# Altium footprint library PcbLib.PcbLib: 428 footprints (part 1 of 27)
Each footprint in its own frame and in the unit in brackets; x right, y up, seen from the top. Pads: shape width x height; smd on the part's side, far side on the other; paste and mask are expansions set on the pad; w line width, h text height; cw(c..) or ccw(c..) is an arc to the next point about the centre after c.
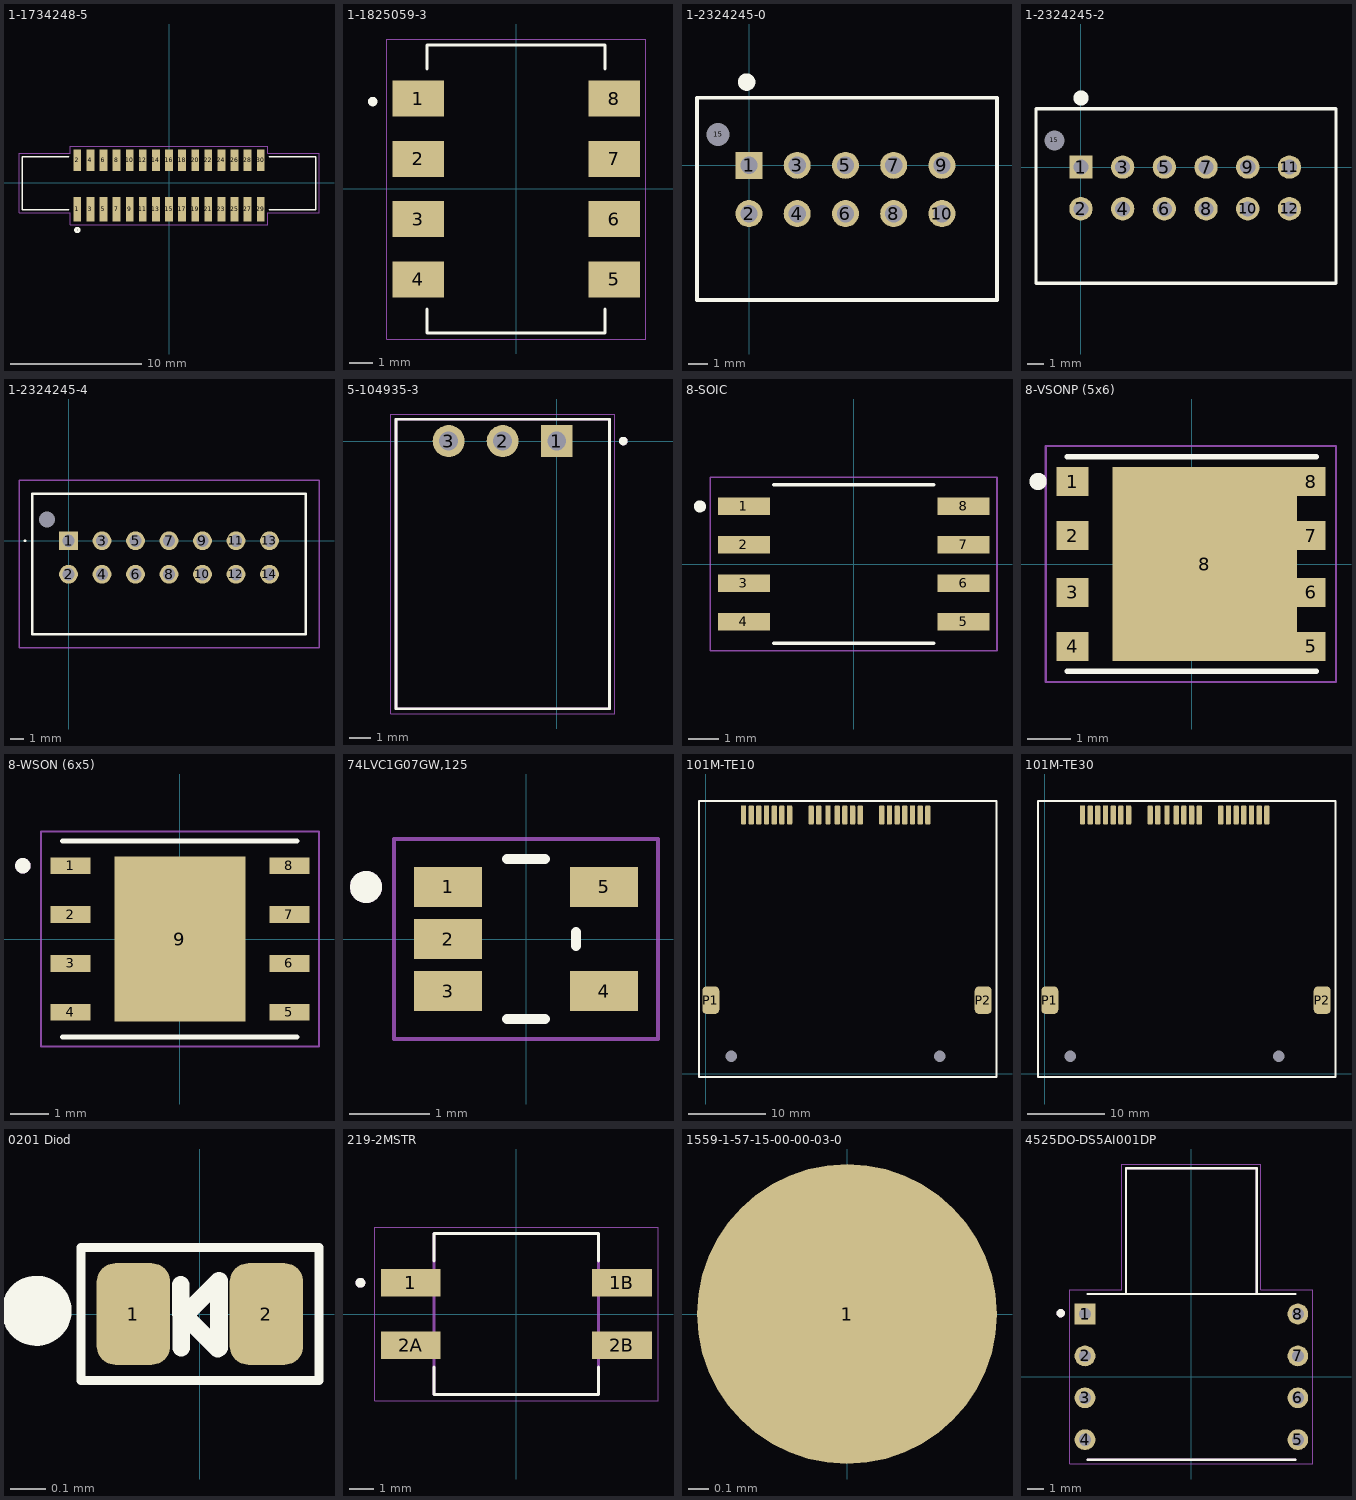
[diagram p0: the footprints below, top view; thin cyan lines are the x and y axes]

## 1-1734248-5 [mm]
pads (30):
  rect 0.6x1.85 smd: 1(-7,-2.025) 3(-6,-2.025) 5(-5,-2.025) 7(-4,-2.025) 9(-3,-2.025) 11(-2,-2.025) 13(-1,-2.025) 15(0,-2.025) 17(1,-2.025) 19(2,-2.025) 21(3,-2.025) 23(4,-2.025) 25(5,-2.025) 27(6,-2.025) 29(7,-2.025)
  rect 0.6x1.65 smd: 2(-7,1.725) 4(-6,1.725) 6(-5,1.725) 8(-4,1.725) 10(-3,1.725) 12(-2,1.725) 14(-1,1.725) 16(0,1.725) 18(1,1.725) 20(2,1.725) 22(3,1.725) 24(4,1.725) 26(5,1.725) 28(6,1.725) 30(7,1.725)
Top Overlay:
  circle w0.2: c-7,-3.6 r0.141
  lines w0.127: -7.65,-2.05 -11.2,-2.05 -11.2,2 -7.65,2 ; 7.65,-2.05 11.2,-2.05 11.2,2 7.65,2
Mechanical 15:
  lines w0.05: -11.45,-2.3 -7.55,-2.3 -7.55,-3.2 7.55,-3.2 7.55,-2.3 11.45,-2.3 11.45,2.25 7.55,2.25 7.55,2.8 -7.55,2.8 -7.55,2.25 -11.45,2.25 -11.45,-2.3
3D body "1-1734248-5--3DModel-STEP-56544.STEP": height 7.7, standoff 0, extent -11.2,-2.551 11.2,2.298

## 1-1825059-3 [mm]
pads (8):
  rect 2.16x1.52 smd: 1(-4.13,3.81) 2(-4.13,1.27) 3(-4.13,-1.27) 4(-4.13,-3.81) 5(4.13,-3.81) 6(4.13,-1.27) 7(4.13,1.27) 8(4.13,3.81)
Top Overlay:
  circle w0.2: c-6.044,3.684 r0.1
  lines w0.127: -3.75,-5.064 -3.75,-6.07 3.75,-6.07 3.75,-5.064 ; -3.75,5.064 -3.75,6.07 3.75,6.07 3.75,5.064
Mechanical 15:
  lines w0.05: -5.455,-6.32 -5.455,6.32 5.455,6.32 5.455,-6.32 -5.455,-6.32
3D body "1-1825059-3.stp": height 4.57, standoff 0.13, extent -4.659,-6.07 4.659,6.07

## 1-2324245-0 [mm]
pads (11):
  rect 1.4x1.4 hole 0.9: 1(0,0)
  round 1.4 hole 0.9: 2(0,-2.5) 3(2.5,0) 4(2.5,-2.5) 5(5,0) 6(5,-2.5) 7(7.5,0) 8(7.5,-2.5) 9(10,0) 10(10,-2.5)
  round 0.6 hole 1.2 unplated: 15(-1.6,1.6)
Top Overlay:
  lines w0.2: -2.695,-6.97 12.852,-6.97 12.852,3.5 -2.695,3.5 -2.695,-6.97
  lines w0.508: -0.326,4.318 cw(c-0.126,4.318) 0.074,4.318 cw(c-0.126,4.318) -0.326,4.318
3D body "1-2324245-0.stp": height 10, standoff -3.2, extent -2.64,-6.985 12.75,3.485

## 1-2324245-2 [mm]
pads (13):
  rect 1.4x1.4 hole 0.9: 1(0,0)
  round 1.4 hole 0.9: 2(0,-2.5) 3(2.5,0) 4(2.5,-2.5) 5(5,0) 6(5,-2.5) 7(7.5,0) 8(7.5,-2.5) 9(10,0) 10(10,-2.5) 11(12.5,0) 12(12.5,-2.5)
  round 0.6 hole 1.2 unplated: 15(-1.6,1.6)
Top Overlay:
  lines w0.2: -2.695,-6.97 -2.695,3.5 15.291,3.5 15.291,-6.97 -2.695,-6.97
  lines w0.508: -0.199,4.14 ccw(c0.001,4.14) 0.201,4.14 ccw(c0.001,4.14) -0.199,4.14
3D body "1-2324245-2.stp": height 10, standoff -3.2, extent -2.646,-6.99 15.244,3.48

## 1-2324245-4 [mm]
pads (15):
  rect 1.4x1.4 hole 0.9: 1(0,0)
  round 1.4 hole 0.9: 2(0,-2.5) 3(2.5,0) 4(2.5,-2.5) 5(5,0) 6(5,-2.5) 7(7.5,0) 8(7.5,-2.5) 9(10,0) 10(10,-2.5) 11(12.5,0) 12(12.5,-2.5) 13(15,0) 14(15,-2.5)
  round 0.6 hole 1.2 unplated: 15(-1.6,1.6)
Top Overlay:
  lines w0.1: -3.3,0 ccw(c-3.25,0) -3.2,0 ccw(c-3.25,0) -3.3,0
  lines w0.2: -2.695,-6.97 -2.695,3.5 17.695,3.5 17.695,-6.97 -2.695,-6.97
Mechanical 15:
  lines w0.1: -3.695,-7.97 -3.695,4.5 18.695,4.5 18.695,-7.97 -3.695,-7.97
3D body "1-2324245-4.stp": height 9.83, standoff -3.37, extent -2.695,-6.97 17.695,3.5

## 5-104935-3 [mm]
pads (3):
  rect 1.5x1.5 hole 0.89: 1(0,0)
  round 1.5 hole 0.89: 2(-2.54,0) 3(-5.08,0)
Top Overlay:
  circle w0.2: c3.125,0 r0.1
  lines w0.127: -7.555,-12.57 2.475,-12.57 2.475,1.02 -7.555,1.02 -7.555,-12.57
Mechanical 13:
  circle w0.2: c3.125,0 r0.1
  lines w0.127: -7.555,-12.57 2.475,-12.57 ; -7.555,-12.57 2.475,-12.57 ; -7.555,-12.57 -7.555,1.02 2.475,1.02 2.475,-12.57
Mechanical 15:
  lines w0.05: -7.805,-12.82 2.725,-12.82 2.725,1.27 -7.805,1.27 -7.805,-12.82
3D body "5-104935-3.stp": height 7.06, standoff -3.22, extent -7.541,-12.561 2.489,1.029
3D body "5-103960-2.STEP": height 8.29, standoff 0.67, extent -6.299,-18.923 1.27,-3.683

## 8-SOIC [mm]
pads (8):
  rect 1.71x0.58 smd: 1(-3.63,1.905) 2(-3.63,0.635) 3(-3.63,-0.635) 4(-3.63,-1.905) 5(3.63,-1.905) 6(3.63,-0.635) 7(3.63,0.635) 8(3.63,1.905)
Top Overlay:
  circle w0.2: c-5.08,1.905 r0.1
  lines w0.127: -2.645,-2.62 2.645,-2.62 ; -2.645,2.62 2.645,2.62
Mechanical 15:
  lines w0.05: -4.735,-2.87 4.735,-2.87 4.735,2.87 -4.735,2.87 -4.735,-2.87
3D body "step_temp.STEP": height 2.16, standoff 0, extent -3.99,-2.62 3.99,2.62

## 8-VSONP (5x6) [mm]
pads (9):
  rect 0.75x0.675 smd paste-1: 1(-2.776,1.917) 2(-2.776,0.66) 3(-2.776,-0.66) 4(-2.776,-1.917)
  rect 0.655x0.675 smd paste-1: 5(2.776,-1.917) 6(2.776,-0.66) 7(2.776,0.66) 8(2.776,1.917)
  rect 4.295x4.51 smd paste-3: 8(0.301,0)
Top Overlay:
  circle w0.3: c-3.578,1.921 r0.05
  lines w0.127: -2.9,-2.5 2.9,-2.5 ; -2.9,2.5 2.9,2.5
Top Paste:
  region: -0.174,0.31 -1.409,0.31 -1.409,1.88 -0.174,1.88
  region: 1.911,0.31 0.327,0.31 0.327,1.88 1.911,1.88
  region: -0.174,-1.883 -1.411,-1.883 -1.411,-0.31 -0.174,-0.31
  region: 1.911,-1.882 0.327,-1.882 0.327,-0.31 1.911,-0.31
  region: 3.026,1.668 2.527,1.668 2.527,2.167 3.026,2.167
  region: 3.026,0.41 2.528,0.41 2.528,0.91 3.026,0.91
  region: 3.026,-0.91 2.528,-0.91 2.528,-0.41 3.026,-0.41
  region: 3.026,-2.172 2.531,-2.172 2.531,-1.667 3.026,-1.667
  region: -2.526,1.67 -3.03,1.67 -3.03,2.167 -2.526,2.167
  region: -2.526,0.41 -3.027,0.41 -3.027,0.91 -2.526,0.91
  region: -2.526,-0.91 -3.026,-0.91 -3.026,-0.41 -2.526,-0.41
  region: -2.526,-2.171 -3.031,-2.171 -3.031,-1.667 -2.526,-1.667
Mechanical 15:
  lines w0.05: -3.401,-2.75 -3.401,2.75 3.354,2.75 3.354,-2.75 -3.401,-2.75
3D body "CSD19533Q5A.STEP": height 1.1, standoff 0, extent -3,-2.45 3,2.45

## 8-WSON (6x5) [mm]
pads (9):
  rect 1.04x0.44 smd: 1(-2.845,1.905) 2(-2.845,0.635) 3(-2.845,-0.635) 4(-2.845,-1.905) 5(2.845,-1.905) 6(2.845,-0.635) 7(2.845,0.635) 8(2.845,1.905)
  rect 3.4x4.3 smd paste-3: 9(0,0)
Top Overlay:
  circle w0.2: c-4.085,1.905 r0.1
  lines w0.127: -3.05,-2.55 3.05,-2.55 ; -3.05,2.55 3.05,2.55
Top Paste:
  region: 1.08,-1.36 -1.08,-1.36 -1.08,1.36 1.08,1.36
Mechanical 13:
  circle w0.2: c-4.085,1.905 r0.1
Mechanical 15:
  lines w0.05: -3.615,-2.8 3.615,-2.8 3.615,2.8 -3.615,2.8 -3.615,-2.8
3D body "step_temp.STEP": height 0.8, standoff 0, extent -3,-2.5 3,2.5

## 74LVC1G07GW,125 [mm]
height 1.1
pads (5):
  rect 0.85x0.5 smd: 1(-0.975,0.65) 2(-0.975,0) 3(-0.975,-0.65) 4(0.975,-0.65) 5(0.975,0.65)
Top Overlay:
  circle w0.2: c-2,0.65 r0.1
  lines w0.127: -0.236,-1 0.236,-1 ; -0.236,1 0.236,1 ; 0.625,-0.086 0.625,0.086
Mechanical 13:
  circle w0.2: c-2,0.65 r0.1
Mechanical 15:
  lines w0.05: -1.65,-1.25 -1.65,1.25 1.65,1.25 1.65,-1.25 -1.65,-1.25
3D body "step_temp.STEP": height 1.1, standoff 0, extent -1.05,-1 1.05,1

## 101M-TE10 [mm]
pads (25):
  rrect50% 0.7x2.5 smd: 1(4.88,33.696) 2(5.88,33.696) 3(6.88,33.696) 4(7.88,33.696) 5(8.88,33.696) 6(9.88,33.696) 7(10.88,33.696) 8(13.68,33.696) 9(14.68,33.696) 10(15.88,33.696) 11(17.08,33.696) 12(18.08,33.696) 13(19.08,33.696) 14(20.08,33.696) 15(22.88,33.696) 16(23.88,33.696) 17(24.88,33.696) 18(25.88,33.696) 19(26.88,33.696) 20(27.88,33.696) 21(28.88,33.696)
  rrect50% 2.2x3.6 smd: P1(0.63,9.596) P2(36.08,9.596)
  round 0 hole 1.5 unplated: ""(3.3,2.296) ""(30.45,2.296)
Top Overlay:
  lines w0.254: -0.89,-0.39 37.8,-0.39 37.8,35.5 -0.89,35.5 -0.89,-0.39
3D body "101M-TE10.STEP": height 5.64, standoff -0.66, extent 0.017,0.009 36.817,34.461

## 101M-TE30 [mm]
pads (25):
  rrect50% 0.7x2.5 smd: 1(4.88,33.696) 2(5.88,33.696) 3(6.88,33.696) 4(7.88,33.696) 5(8.88,33.696) 6(9.88,33.696) 7(10.88,33.696) 8(13.68,33.696) 9(14.68,33.696) 10(15.88,33.696) 11(17.08,33.696) 12(18.08,33.696) 13(19.08,33.696) 14(20.08,33.696) 15(22.88,33.696) 16(23.88,33.696) 17(24.88,33.696) 18(25.88,33.696) 19(26.88,33.696) 20(27.88,33.696) 21(28.88,33.696)
  rrect50% 2.2x3.6 smd: P1(0.63,9.596) P2(36.08,9.596)
  round 0 hole 1.5 unplated: ""(3.3,2.296) ""(30.45,2.296)
Top Overlay:
  lines w0.254: -0.89,-0.39 -0.89,35.5 37.8,35.5 37.8,-0.39 -0.89,-0.39
3D body "101M-TE30_C_1.STEP": height 6.85, standoff -0.7, extent 0,0 36.8,34.453

## 0201 Diod [mm] "DIODFN60X30X36-2N"
pads (2):
  rrect50% 0.21x0.29 smd paste-0.006 mask+0.02: 1(-0.19,0) 2(0.19,0)
Top Overlay:
  circle w0.1: c-0.467,0.009 r0.05
  lines w0.025: -0.05,-0.003 -0.043,-0.003 ; -0.34,-0.19 -0.34,0.19 0.34,0.19 0.34,-0.19 -0.34,-0.19
  lines w0.05: -0.055,0.083 -0.054,-0.096
  lines w0.051: -0.048,-0.001 0.051,-0.099 ; -0.043,-0.003 0.055,0.095 0.055,-0.096
3D body "PMEG3002ESFYL.STEP": height 0.32, standoff 0, extent -0.3,-0.15 0.3,0.15

## 219-2MSTR [mm]
pads (4):
  rect 2.44x1.13 smd: 1(-4.3,1.27) 1B(4.3,1.27) 2A(-4.3,-1.27) 2B(4.3,-1.27)
Top Overlay:
  circle w0.2: c-6.35,1.27 r0.1
  lines w0.127: -3.35,-2.155 -3.35,-3.275 3.35,-3.275 3.35,-2.155 ; -3.35,2.155 -3.35,3.275 3.35,3.275 3.35,2.155
Mechanical 13:
  circle w0.2: c-6.35,1.27 r0.1
  lines w0.127: -3.35,-3.275 -3.35,3.275 3.35,3.275 3.35,-3.275 -3.35,-3.275
Mechanical 15:
  lines w0.05: -5.77,-3.525 5.77,-3.525 5.77,3.525 -5.77,3.525 -5.77,-3.525
3D body "step_temp.STEP": height 4.58, standoff 0, extent -4.955,-3.275 4.955,3.275

## 1559-1-57-15-00-00-03-0 [mm] "TestPoint"
height 0.1
pads (1):
  round 1.5 smd: 1(0,0)
3D body "mill-max-1559.SLDPRT": height 0.8, standoff 0, extent -0.745,-0.751 0.745,0.751

## 4525DO-DS5AI001DP [mm]
pads (8):
  rect 1.238x1.238 hole 0.73: 1(-6.35,3.75)
  round 1.238 hole 0.73: 2(-6.35,1.25) 3(-6.35,-1.25) 4(-6.35,-3.75) 5(6.35,-3.75) 6(6.35,-1.25) 7(6.35,1.25) 8(6.35,3.75)
Top Overlay:
  circle w0.3: c-7.8,3.8 r0.1
  lines w0.127: -6.2,-4.95 6.2,-4.95 ; -6.2,4.95 -3.9,4.95 ; 6.2,4.95 3.9,4.95 ; -3.9,4.95 -3.9,12.45 3.9,12.45 3.9,4.95 ; -3.9,4.95 3.9,4.95
Mechanical 13:
  circle w0.3: c-7.8,3.8 r0.1
  lines w0.127: -6.2,-4.95 6.2,-4.95 ; -6.2,4.95 -3.9,4.95 ; 6.2,4.95 3.9,4.95 ; -3.9,4.95 -3.9,12.45 3.9,12.45 3.9,4.95 ; -3.9,4.95 3.9,4.95
Mechanical 15:
  lines w0.05: -7.25,-5.2 -7.25,5.2 -4.15,5.2 -4.15,12.7 4.15,12.7 4.15,5.2 7.25,5.2 7.25,-5.2 -7.25,-5.2